# Altium integrated library CC_V1.4.IntLib: 156 symbols (part 1 of 2)
Pins are listed as number, name and electrical type; pins without a type are passive.

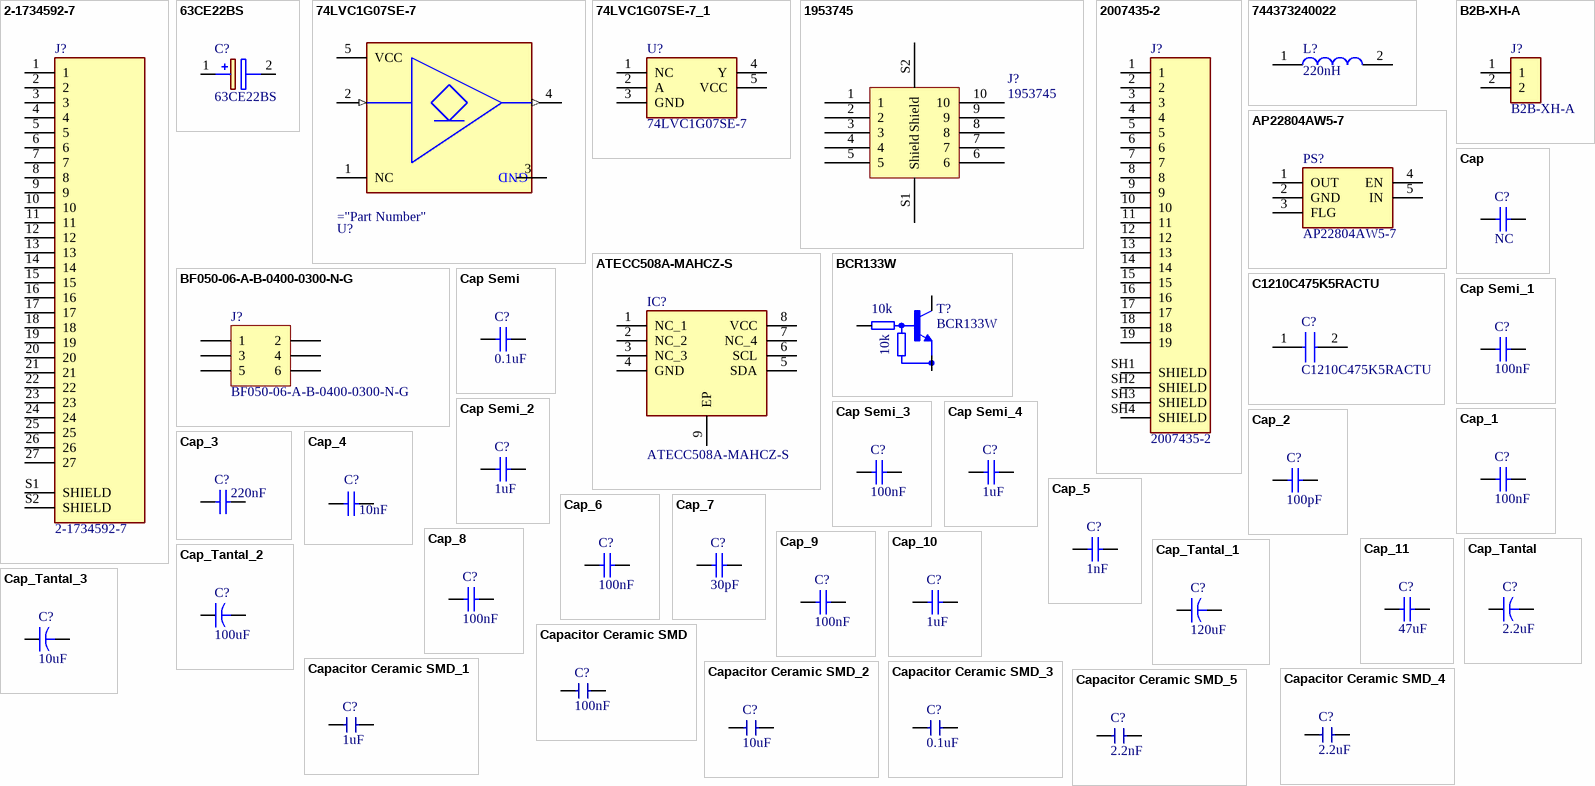
[diagram p0: symbols 2-1734592-7 to Capacitor Ceramic SMD_5]

## 2-1734592-7
designator J?
Package: None; Price: None; Value: *; MP: 2-1734592-7; Availability: Unavailable
footprint TE_2-1734592-7
pins: 1, 2, 3, 4, 5, 6, 7, 8, 9, 10, 11, 12, 13, 14, 15, 16, 17, 18, 19, 20, 21, 22, 23, 24, 25, 26, 27, S1 SHIELD, S2 SHIELD

## 63CE22BS
designator C?
Capacitor Polarised; Manufacturer_Name: Suncon; Value: 22uF; Datasheet Link: http://www.sunelec.co.jp/common/pdf/eng/CE-BS.pdf; Height: 8mm; Manufacturer_Part_Number: 63CE22BS; Arrow Part Number: 63CE22BS
footprint 63CE22BS
pins: 1 +, 2 -

## 74LVC1G07SE-7
designator U?  (value not drawn)
footprint SOT65P210X110-5N
pins: 1 NC, 2 A (in), 3 GND (power), 4 Y (out), 5 VCC (power)

## 74LVC1G07SE-7_1
designator U?, comment 74LVC1G07SE-7
Undefined or Miscellaneous; Manufacturer_Name: Diodes Inc.; Datasheet Link: https://componentsearchengine.com/Datasheets/2/74LVC1G07SE-7.pdf; Height: 1.1mm; Manufacturer_Part_Number: 74LVC1G07SE-7; Mouser Part Number: 621-74LVC1G07SE-7; Mouser Price/Stock: https://www.mouser.co.uk/ProductDetail/Diodes-Incorporated/74LVC1G07SE-7?qs=abZ1nkZpTuNoZmx9wrxFdA%3D%3D; Arrow Part Number: 74LVC1G07SE-7; Arrow Price/Stock: https://www.arrow.com/en/products/74lvc1g07se-7/diodes-incorporated
footprint SOT65P210X110-5N
pins: 1 NC, 2 A, 3 GND, 4 Y, 5 VCC

## 1953745
designator J?
footprint 1953745
footprint 1953745
pins: 1, 2, 3, 4, 5, 6, 7, 8, 9, 10, S1 Shield, S2 Shield

## 2007435-2
designator J?
Conn HDMI RCP 19 POS Solder RA Thru-Hole 19 Terminal 1 Port T/R; MF: TE Connectivity; Value: *; Package: None; MP: 2007435-2; Price: None; Availability: Unavailable; SnapEDA_Link: https://www.snapeda.com/parts/2007435-2/TE%20Connectivity%20AMP%20Connectors/view-part/1316516/?ref=snap
footprint TE_2007435-2
pins: 1, 2, 3, 4, 5, 6, 7, 8, 9, 10, 11, 12, 13, 14, 15, 16, 17, 18, 19, SH1 SHIELD, SH2 SHIELD, SH3 SHIELD, SH4 SHIELD

## 744373240022
designator L?, comment 220nH
744373240022; Manufacturer_Name: Wurth Elektronik; Datasheet Link: http://componentsearchengine.com/Datasheets/1/744373240022.pdf; Manufacturer_Part_Number: 744373240022; Arrow Part Number: 744373240022; Mouser Part Number: 710-744373240022; Mouser Price/Stock: https://www.mouser.co.uk/ProductDetail/Wurth-Elektronik/744373240022?qs=cFlH0mFHHFrAuUoRjqUUNw%3D%3D; Part Number: 744373240022
footprint WE-LHMI_402048
pins: 1, 2

## AP22804AW5-7
designator PS?
Power Supply; Manufacturer_Name: Diodes Inc.; Datasheet Link: https://componentsearchengine.com/Datasheets/2/AP22804AW5-7.pdf; Height: 1.4mm; Manufacturer_Part_Number: AP22804AW5-7; Mouser Part Number: 621-AP22804AW5-7; Mouser Price/Stock: https://www.mouser.co.uk/ProductDetail/Diodes-Incorporated/AP22804AW5-7?qs=lqAf%2FiVYw9hgcUuNhFapmA%3D%3D; Arrow Part Number: AP22804AW5-7; Arrow Price/Stock: https://www.arrow.com/en/products/ap22804aw5-7/diodes-incorporated
footprint SOT95P285X140-5N
pins: 1 OUT, 2 GND, 3 FLG, 4 EN, 5 IN

## ATECC508A-MAHCZ-S
designator IC?
Integrated Circuit; Manufacturer_Name: Microchip; Datasheet Link: http://www.mouser.com/ds/2/268/Atmel-8923S-CryptoAuth-ATECC508A-Datasheet-Summary-1065793.pdf; Height: 0.6mm; Manufacturer_Part_Number: ATECC508A-MAHCZ-S; Mouser Part Number: 556-ATECC508AMAHCZS; Mouser Price/Stock: https://www.mouser.co.uk/ProductDetail/Microchip-Technology-Atmel/ATECC508A-MAHCZ-S?qs=%2FPOkb%252BiDxRUOydmISUnqmg%3D%3D; Arrow Part Number: ATECC508A-MAHCZ-S; Arrow Price/Stock: https://www.arrow.com/en/products/atecc508a-mahcz-s/microchip-technology
footprint SON50P300X200X60-9N
footprint DFN200X300X60-9N
pins: 1 NC_1, 2 NC_2, 3 NC_3, 4 GND, 5 SDA, 6 SCL, 7 NC_4, 8 VCC, 9 EP

## B2B-XH-A
designator J?, comment Part Number: B2B-XH-A  (hidden comment: XH Connector)
Header Through Hole 2 position (2.50mm); Manufacturer_Name: JST Sales America; Datasheet Link: http://www.jst-mfg.com/product/pdf/eng/eXH.pdf; Height: 7mm; Link: https://www.digikey.sg/product-detail/en/jst-sales-america-inc/B2B-XH-A-LF-SN/455-2247-ND/1651045
footprint B2B-XH-A
pins: 1, 2
2 alternate drawings of the same symbol

## BCR133W
designator T?
<b>NPN Silicon Digital Transistor</b>  50V 0,1A 0,25W; Package: None; Price: None; Value: *; MP: BCR133W; Availability: Unavailable
footprint SOT323-BEC
pins: B, C, E
text: 10k

## BF050-06-A-B-0400-0300-N-G
designator J?, comment Part Number: BF050-06-A-B-0400-0300-N-G  (hidden comment: Pin Header pitch 2.00 mm, 6 pin)
Pin Number: 6; Pitch: 2.00 mm; Row Number: Dual; Link: https://gct.co/connector/bf050
footprint BF050-06-A-B-0400-0300-N-G
pins: 1, 2, 3, 4, 5, 6
2 alternate drawings of the same symbol

## C1210C475K5RACTU
designator C?
Capacitor, 4.7uF, 50V; Manufacturer_Name: Kemet; Datasheet Link: https://componentsearchengine.com/Datasheets/2/C1210C475K5RACTU.pdf; Height: 2.8mm; Manufacturer_Part_Number: C1210C475K5RACTU; Arrow Part Number: C1210C475K5RACTU; Arrow Price/Stock: https://www.arrow.com/en/products/c1210c475k5ractu/kemet-corporation; Mouser Part Number: 80-C1210C475K5R; Mouser Price/Stock: https://www.mouser.co.uk/ProductDetail/KEMET/C1210C475K5RACTU?qs=dB0LedT%252BmmBpncka1nOCUg%3D%3D; Value: 4.7uF; Voltage: 50V; Package: 1210
footprint CAPC3225X280N
pins: 1, 2

## Cap
designator C?  value NC  (hidden comment: Cap)
SMD capacitor; Part Number: SMD CAP (0603)
footprint CAP (0402)
footprint CAP (0603)
footprint CAP (0805)
footprint CAP (1206)
footprint CAP (0201) (Chip Capacitor, 2-Leads, Body 0/60x0/30mm, IPC Medium Density DESIGNER:ABBAS BASEREH)
pins: 1, 2

## Cap Semi
designator C?, comment 0.1uF
Capacitor (Semiconductor SIM Model); Value: 2.2nf; Published: 8-Jun-2000; LatestRevisionDate: 17-Jul-2002; LatestRevisionNote: Re-released for DXP Platform.; PackageReference: C1206; Publisher: Altium Limited
footprint C1206
footprint 0402
footprint 1310[0504]
footprint 1608[0603]
footprint C 0805 (Chip Capacitor; Body 2.0 x 1.2 mm (LxW typ))
footprint C0603
pins: 1, 2
2 alternate drawings of the same symbol

## Cap Semi_1
designator C?, comment value 100nF  (hidden comment: Cap Semi)
Capacitor (Semiconductor SIM Model); Published: 8-Jun-2000; LatestRevisionDate: 29-May-2009; LatestRevisionNote: IPC-7351 Footprint Added.; PackageReference: C1206; Publisher: Altium Limited; PackageDescription: Chip Capacitor
footprint C1206 (Chip Capacitor, Body 3.2x1.6mm, IPC High Density)
footprint 0402 (Chip Capacitor, Body 1.0x0.5mm, IPC High Density)
footprint C2512 (Chip Capacitor, Body 2.54x1.27mm, IPC High Density)
footprint 1608[0603] (Chip Capacitor, Body 1.6x0.8mm, IPC High Density)
footprint C1210 (Chip Capacitor, Body 3.2x2.5mm, IPC High Density)
simulation model CAP (Semiconductor Capacitor)
signal-integrity model Cap Semi
pins: 1, 2

## Cap Semi_2
designator C?, comment 1uF
Capacitor (Semiconductor SIM Model); Value: 2.2nf; Published: 8-Jun-2000; LatestRevisionDate: 17-Jul-2002; LatestRevisionNote: Re-released for DXP Platform.; PackageReference: C1206; Publisher: Altium Limited
footprint C1206
footprint 0402
footprint 1310[0504]
footprint 1608[0603]
footprint C 0805 (Chip Capacitor; Body 2.0 x 1.2 mm (LxW typ))
footprint C0603
pins: 1, 2
2 alternate drawings of the same symbol

## Cap Semi_3
designator C?, comment 100nF
Capacitor (Semiconductor SIM Model); Value: 2.2nf; Published: 8-Jun-2000; LatestRevisionDate: 17-Jul-2002; LatestRevisionNote: Re-released for DXP Platform.; PackageReference: C1206; Publisher: Altium Limited
footprint C1206
footprint 0402
footprint 1310[0504]
footprint 1608[0603]
footprint C 0805 (Chip Capacitor; Body 2.0 x 1.2 mm (LxW typ))
footprint C0603
pins: 1, 2
2 alternate drawings of the same symbol

## Cap Semi_4
designator C?  value 1uF
Capacitor (Semiconductor SIM Model); Published: 8-Jun-2000; LatestRevisionDate: 29-May-2009; LatestRevisionNote: IPC-7351 Footprint Added.; PackageReference: C1206; Publisher: Altium Limited; PackageDescription: Chip Capacitor
footprint C 0805 (Chip Capacitor; Body 2.0 x 1.2 mm (LxW typ))
footprint CAPC1005L (Chip Capacitor, Body 1.0x0.5mm, IPC High Density)
footprint CAPC2512L (Chip Capacitor, Body 2.54x1.27mm, IPC High Density)
footprint CAPC1608L (Chip Capacitor, Body 1.6x0.8mm, IPC High Density)
footprint CAPC3225L (Chip Capacitor, Body 3.2x2.5mm, IPC High Density)
simulation model CAP (Semiconductor Capacitor)
signal-integrity model Cap Semi
footprint C0603
pins: 1, 2

## Cap_1
designator C?, comment value 100nF  (hidden comment: Cap)
SMD capacitor; Part Number: SMD CAP (0603); Voltage: 50V
footprint CAP (0402)
footprint CAP (0603)
footprint CAP (0805)
footprint CAP (1206)
footprint CAP (0201) (Chip Capacitor, 2-Leads, Body 0/60x0/30mm, IPC Medium Density DESIGNER:ABBAS BASEREH)
pins: 1, 2

## Cap_2
designator C?, comment value 100pF  (hidden comment: Cap)
SMD capacitor; Part Number: SMD CAP (0603); Voltage: 50V
footprint CAP (0402)
footprint CAP (0603)
footprint CAP (0805)
footprint CAP (1206)
footprint CAP (0201) (Chip Capacitor, 2-Leads, Body 0/60x0/30mm, IPC Medium Density DESIGNER:ABBAS BASEREH)
pins: 1, 2

## Cap_3
designator C?, comment value 220nF  (hidden comment: Cap)
SMD capacitor; Part Number: SMD CAP (0603)
footprint CAP (0402)
footprint CAP (0603)
footprint CAP (0805)
footprint CAP (1206)
footprint CAP (0201) (Chip Capacitor, 2-Leads, Body 0/60x0/30mm, IPC Medium Density DESIGNER:ABBAS BASEREH)
pins: 1, 2

## Cap_4
designator C?, comment 10nF
SMD capacitor; Value: 10nF
footprint CAP (0402)
footprint CAP (0603)
footprint CAP (0805)
footprint CAP (1206)
footprint CAP (0201) (Chip Capacitor, 2-Leads, Body 0/60x0/30mm, IPC Medium Density DESIGNER:ABBAS BASEREH)
pins: 1, 2

## Cap_5
designator C?, comment 1nF
SMD capacitor; Value: 1nF
footprint CAP (0402)
footprint CAP (0603)
footprint CAP (0805)
footprint CAP (1206)
footprint CAP (0201) (Chip Capacitor, 2-Leads, Body 0/60x0/30mm, IPC Medium Density DESIGNER:ABBAS BASEREH)
pins: 1, 2

## Cap_6
designator C?, comment 100nF
SMD capacitor; Value: 100nF
footprint CAP (0402)
footprint CAP (0603)
footprint CAP (0805)
footprint CAP (1206)
footprint CAP (0201) (Chip Capacitor, 2-Leads, Body 0/60x0/30mm, IPC Medium Density DESIGNER:ABBAS BASEREH)
pins: 1, 2

## Cap_7
designator C?, comment value 30pF  (hidden comment: Cap)
SMD capacitor; Voltage: 50V
footprint CAP (0402)
footprint CAP (0603)
footprint CAP (0805)
footprint CAP (1206)
footprint CAP (0201) (Chip Capacitor, 2-Leads, Body 0/60x0/30mm, IPC Medium Density DESIGNER:ABBAS BASEREH)
pins: 1, 2

## Cap_8
designator C?, comment value 100nF  (hidden comment: Cap)
SMD capacitor; Voltage: 50V
footprint CAP (0402)
footprint CAP (0603)
footprint CAP (0805)
footprint CAP (1206)
footprint CAP (0201) (Chip Capacitor, 2-Leads, Body 0/60x0/30mm, IPC Medium Density DESIGNER:ABBAS BASEREH)
pins: 1, 2

## Cap_9
designator C?, comment value 100nF  (hidden comment: Cap)
SMD capacitor; Part Number: SMD CAP (0603); Voltage: 50V
footprint CAP (0402)
footprint CAP (0603)
footprint CAP (0805)
footprint CAP (1206)
pins: 1, 2
2 alternate drawings of the same symbol

## Cap_10
designator C?, comment value 1uF  (hidden comment: Cap)
SMD capacitor; Part Number: SMD CAP (0603); Voltage: 50V
footprint CAP (0402)
footprint CAP (0603)
footprint CAP (0805)
footprint CAP (1206)
pins: 1, 2
2 alternate drawings of the same symbol

## Cap_11
designator C?, comment value 47uF  (hidden comment: Cap)
SMD capacitor; Voltage: 50V
footprint CAP (0402)
footprint CAP (0603)
footprint CAP (0805)
footprint CAP (1206)
footprint CAP (0201) (Chip Capacitor, 2-Leads, Body 0/60x0/30mm, IPC Medium Density DESIGNER:ABBAS BASEREH)
pins: 1, 2

## Cap_Tantal
designator C?  value 2.2uF  (hidden comment: Cap_Tantal)
Tantalum Capacitor; Voltage: 10V
footprint TANTAL (SIZE A)
footprint TANTAL (SIZE B)
footprint TANTAL (SIZE C)
footprint TANTAL (SIZE D)
pins: 1, 2
2 alternate drawings of the same symbol

## Cap_Tantal_1
designator C?, comment value 120uF  (hidden comment: Cap_Tantal)
Tantalum Capacitor; Voltage: 10V
footprint TANTAL (SIZE A) (Capacitor, SM Tantalum; Body 3.2 x 1.6 mm (LxW typ))
footprint TANTAL (SIZE B) (Capacitor, SM Tantalum; Body 3.5 x 2.8 mm (LxW typ))
footprint TANTAL (SIZE C) (Capacitor, SM Tantalum; Body 6.0 x 3.2 mm (LxW typ))
footprint TANTAL (SIZE D) (Capacitor, SM Tantalum; Body 7.3 x 4.3 mm (LxW typ))
footprint TANTAL (SIZE E) (Capacitor, SM Tantalum; Body 7.3 x 6.0 mm (LxW typ))
pins: 1, 2

## Cap_Tantal_2
designator C?, comment value 100uF  (hidden comment: Cap_Tantal)
Tantalum Capacitor; Voltage: 10V
footprint TANTAL (SIZE A) (Capacitor, SM Tantalum; Body 3.2 x 1.6 mm (LxW typ))
footprint TANTAL (SIZE B) (Capacitor, SM Tantalum; Body 3.5 x 2.8 mm (LxW typ))
footprint TANTAL (SIZE C) (Capacitor, SM Tantalum; Body 6.0 x 3.2 mm (LxW typ))
footprint TANTAL (SIZE D) (Capacitor, SM Tantalum; Body 7.3 x 4.3 mm (LxW typ))
footprint TANTAL (SIZE E) (Capacitor, SM Tantalum; Body 7.3 x 6.0 mm (LxW typ))
pins: 1, 2

## Cap_Tantal_3
designator C?, comment value 10uF  (hidden comment: Cap_Tantal)
Tantalum Capacitor; Voltage: 10V
footprint TANTAL (SIZE A) (Capacitor, SM Tantalum; Body 3.2 x 1.6 mm (LxW typ))
footprint TANTAL (SIZE B) (Capacitor, SM Tantalum; Body 3.5 x 2.8 mm (LxW typ))
footprint TANTAL (SIZE C) (Capacitor, SM Tantalum; Body 6.0 x 3.2 mm (LxW typ))
footprint TANTAL (SIZE D) (Capacitor, SM Tantalum; Body 7.3 x 4.3 mm (LxW typ))
footprint TANTAL (SIZE E) (Capacitor, SM Tantalum; Body 7.3 x 6.0 mm (LxW typ))
pins: 1, 2

## Capacitor Ceramic SMD
designator C?, comment value 100nF  (hidden comment: Ceramic Capacitor SMD)
Voltage: 10v; Tolerance: *%
footprint 0402 Capacitor
footprint 0603 Capacitor
footprint 0805 Capacitor
footprint 1206 Capacitor
footprint 1210 CAPACITOR
footprint 0201 Capacitor
footprint CAP1210 (Chip Capacitor, 2-Leads, Body 3/20x2/50mm, IPC Medium Density DESIGNER:ABBAS BASEREH)
footprint CAP1812 (Chip Capacitor, 2-Leads, Body 4/50x3/20mm, IPC Medium Density DESIGNER:ABBAS BASEREH)
footprint CAP2010 (Chip Capacitor, 2-Leads, Body 5/00x2/50mm, IPC Medium Density DESIGNER:ABBAS BASEREH)
footprint CAP2512 (Chip Capacitor, 2-Leads, Body 6/40x3/20mm, IPC Medium Density DESIGNER:ABBAS BASEREH)
pins: 1, 2

## Capacitor Ceramic SMD_1
designator C?, comment value 1uF  (hidden comment: Ceramic Capacitor SMD)
Voltage: 10v; Tolerance: *%
footprint 0402 Capacitor
footprint 0603 Capacitor
footprint 0805 Capacitor
footprint 1206 Capacitor
footprint 1210 CAPACITOR
footprint 0201 Capacitor
footprint CAP1210 (Chip Capacitor, 2-Leads, Body 3/20x2/50mm, IPC Medium Density DESIGNER:ABBAS BASEREH)
footprint CAP1812 (Chip Capacitor, 2-Leads, Body 4/50x3/20mm, IPC Medium Density DESIGNER:ABBAS BASEREH)
footprint CAP2010 (Chip Capacitor, 2-Leads, Body 5/00x2/50mm, IPC Medium Density DESIGNER:ABBAS BASEREH)
footprint CAP2512 (Chip Capacitor, 2-Leads, Body 6/40x3/20mm, IPC Medium Density DESIGNER:ABBAS BASEREH)
pins: 1, 2

## Capacitor Ceramic SMD_2
designator C?, comment value 10uF  (hidden comment: Ceramic Capacitor SMD)
Voltage: 10v; Tolerance: *%
footprint 0402 Capacitor
footprint 0603 Capacitor
footprint 0805 Capacitor
footprint 1206 Capacitor
footprint 1210 CAPACITOR
footprint 0201 Capacitor
footprint CAP1210 (Chip Capacitor, 2-Leads, Body 3/20x2/50mm, IPC Medium Density DESIGNER:ABBAS BASEREH)
footprint CAP1812 (Chip Capacitor, 2-Leads, Body 4/50x3/20mm, IPC Medium Density DESIGNER:ABBAS BASEREH)
footprint CAP2010 (Chip Capacitor, 2-Leads, Body 5/00x2/50mm, IPC Medium Density DESIGNER:ABBAS BASEREH)
footprint CAP2512 (Chip Capacitor, 2-Leads, Body 6/40x3/20mm, IPC Medium Density DESIGNER:ABBAS BASEREH)
pins: 1, 2

## Capacitor Ceramic SMD_3
designator C?, comment value 0.1uF  (hidden comment: Ceramic Capacitor SMD)
Voltage: 10v; Tolerance: *%
footprint 0402 Capacitor
footprint 0603 Capacitor
footprint 0805 Capacitor
footprint 1206 Capacitor
footprint 1210 CAPACITOR
footprint 0201 Capacitor
footprint CAP1210 (Chip Capacitor, 2-Leads, Body 3/20x2/50mm, IPC Medium Density DESIGNER:ABBAS BASEREH)
footprint CAP1812 (Chip Capacitor, 2-Leads, Body 4/50x3/20mm, IPC Medium Density DESIGNER:ABBAS BASEREH)
footprint CAP2010 (Chip Capacitor, 2-Leads, Body 5/00x2/50mm, IPC Medium Density DESIGNER:ABBAS BASEREH)
footprint CAP2512 (Chip Capacitor, 2-Leads, Body 6/40x3/20mm, IPC Medium Density DESIGNER:ABBAS BASEREH)
pins: 1, 2

## Capacitor Ceramic SMD_4
designator C?, comment value 2.2uF  (hidden comment: Ceramic Capacitor SMD)
Voltage: 10v; Tolerance: *%
footprint 0402 Capacitor
footprint 0603 Capacitor
footprint 0805 Capacitor
footprint 1206 Capacitor
footprint 1210 CAPACITOR
footprint 0201 Capacitor
footprint CAP1210 (Chip Capacitor, 2-Leads, Body 3/20x2/50mm, IPC Medium Density DESIGNER:ABBAS BASEREH)
footprint CAP1812 (Chip Capacitor, 2-Leads, Body 4/50x3/20mm, IPC Medium Density DESIGNER:ABBAS BASEREH)
footprint CAP2010 (Chip Capacitor, 2-Leads, Body 5/00x2/50mm, IPC Medium Density DESIGNER:ABBAS BASEREH)
footprint CAP2512 (Chip Capacitor, 2-Leads, Body 6/40x3/20mm, IPC Medium Density DESIGNER:ABBAS BASEREH)
pins: 1, 2

## Capacitor Ceramic SMD_5
designator C?, comment value 2.2nF  (hidden comment: Ceramic Capacitor SMD)
Voltage: 10v; Tolerance: *%
footprint 0402 Capacitor
footprint 0603 Capacitor
footprint 0805 Capacitor
footprint 1206 Capacitor
footprint 1210 CAPACITOR
footprint 0201 Capacitor
footprint CAP1210 (Chip Capacitor, 2-Leads, Body 3/20x2/50mm, IPC Medium Density DESIGNER:ABBAS BASEREH)
footprint CAP1812 (Chip Capacitor, 2-Leads, Body 4/50x3/20mm, IPC Medium Density DESIGNER:ABBAS BASEREH)
footprint CAP2010 (Chip Capacitor, 2-Leads, Body 5/00x2/50mm, IPC Medium Density DESIGNER:ABBAS BASEREH)
footprint CAP2512 (Chip Capacitor, 2-Leads, Body 6/40x3/20mm, IPC Medium Density DESIGNER:ABBAS BASEREH)
pins: 1, 2

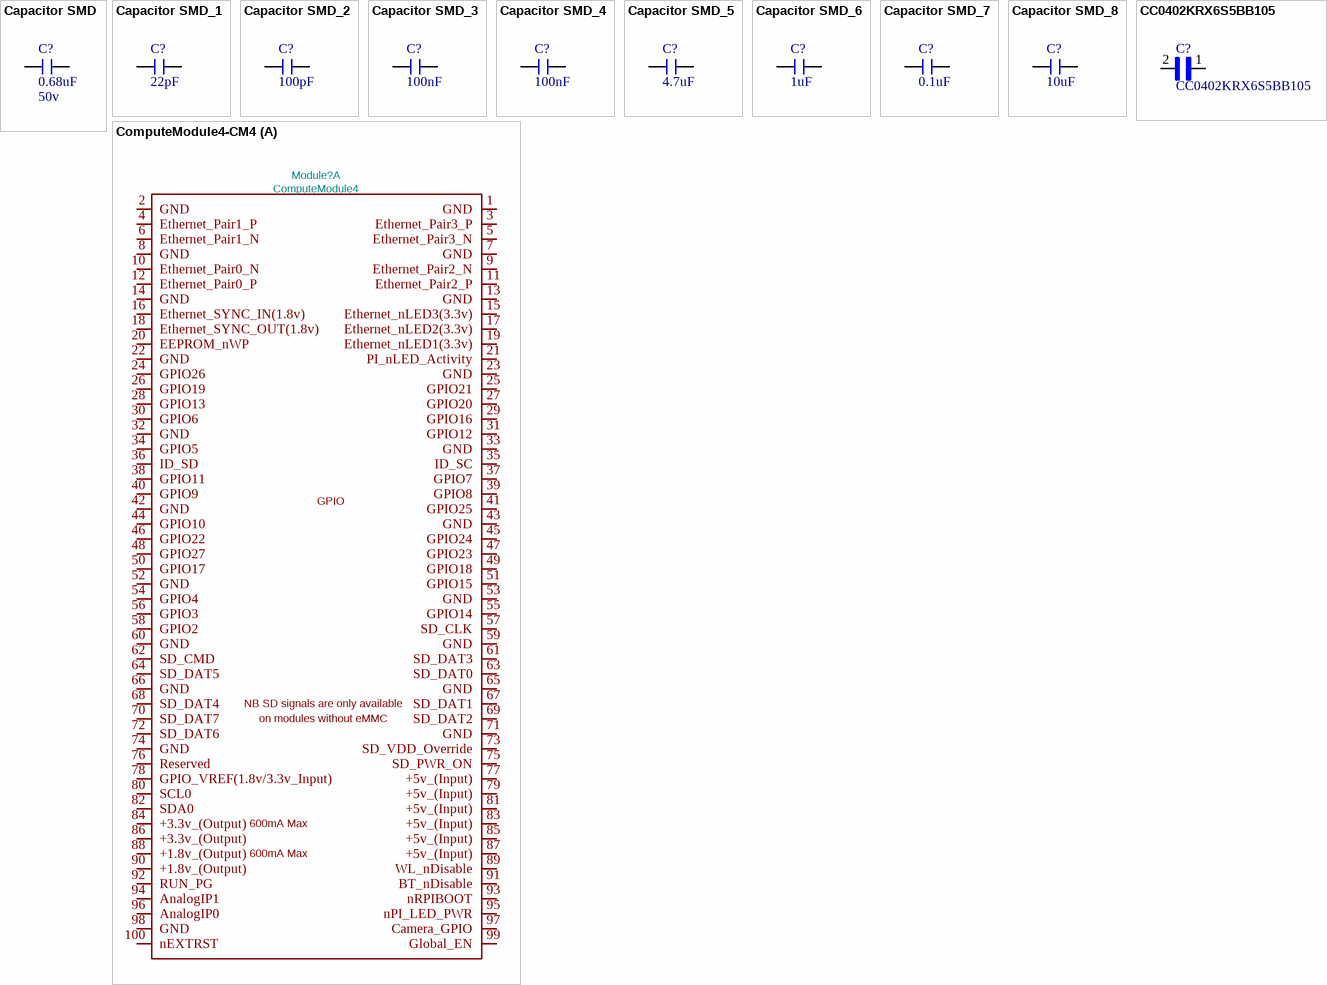
[diagram p1: symbols Capacitor SMD to ComputeModule4-CM4]

## Capacitor SMD
designator C?  value 0.68uF  Voltage: 50v  (hidden comment: Capacitor SMD)
footprint 0402 Capacitor
footprint 0603 Capacitor
footprint 0805 Capacitor
footprint 1206 Capacitor
pins: 1, 2
2 alternate drawings of the same symbol

## Capacitor SMD_1
designator C?, comment value 22pF  (hidden comment: Capacitor SMD)
Voltage: 50v
footprint 0402 Capacitor
footprint 0603 Capacitor
footprint 0805 Capacitor
footprint 1206 Capacitor
pins: 1, 2
2 alternate drawings of the same symbol

## Capacitor SMD_2
designator C?, comment value 100pF  (hidden comment: Capacitor SMD)
Voltage: 50v
footprint 0402 Capacitor
footprint 0603 Capacitor
footprint 0805 Capacitor
footprint 1206 Capacitor
pins: 1, 2
2 alternate drawings of the same symbol

## Capacitor SMD_3
designator C?, comment value 100nF  (hidden comment: Capacitor SMD)
SMD capacitor; Voltage: 50v
footprint 0402 Capacitor
footprint 0603 Capacitor
footprint 0805 Capacitor
footprint 1206 Capacitor
pins: 1, 2
2 alternate drawings of the same symbol

## Capacitor SMD_4
designator C?, comment value 100nF  (hidden comment: Capacitor SMD)
Voltage: 50v
footprint 0402 Capacitor
footprint 0603 Capacitor
footprint 0805 Capacitor
footprint 1206 Capacitor
pins: 1, 2
2 alternate drawings of the same symbol

## Capacitor SMD_5
designator C?, comment value 4.7uF  (hidden comment: Capacitor SMD)
Voltage: 50v
footprint 0402 Capacitor
footprint 0603 Capacitor
footprint 0805 Capacitor
footprint 1206 Capacitor
pins: 1, 2
2 alternate drawings of the same symbol

## Capacitor SMD_6
designator C?, comment value 1uF  (hidden comment: Capacitor SMD)
Voltage: 50v
footprint 0402 Capacitor
footprint 0603 Capacitor
footprint 0805 Capacitor
footprint 1206 Capacitor
pins: 1, 2
2 alternate drawings of the same symbol

## Capacitor SMD_7
designator C?, comment value 0.1uF  (hidden comment: Capacitor SMD)
Voltage: 50v
footprint 0402 Capacitor
footprint 0603 Capacitor
footprint 0805 Capacitor
footprint 1206 Capacitor
pins: 1, 2
2 alternate drawings of the same symbol

## Capacitor SMD_8
designator C?, comment value 10uF  (hidden comment: Capacitor SMD)
Voltage: 50v
footprint 0402 Capacitor
footprint 0603 Capacitor
footprint 0805 Capacitor
footprint 1206 Capacitor
pins: 1, 2
2 alternate drawings of the same symbol

## CC0402KRX6S5BB105
designator C?
CAP CER 1UF 6.3V X6S 0402; Package: None; Price: None; Value: *; MP: CC0402KRX6S5BB105; Availability: Unavailable
footprint CAPC1005X55N
pins: 1, 2

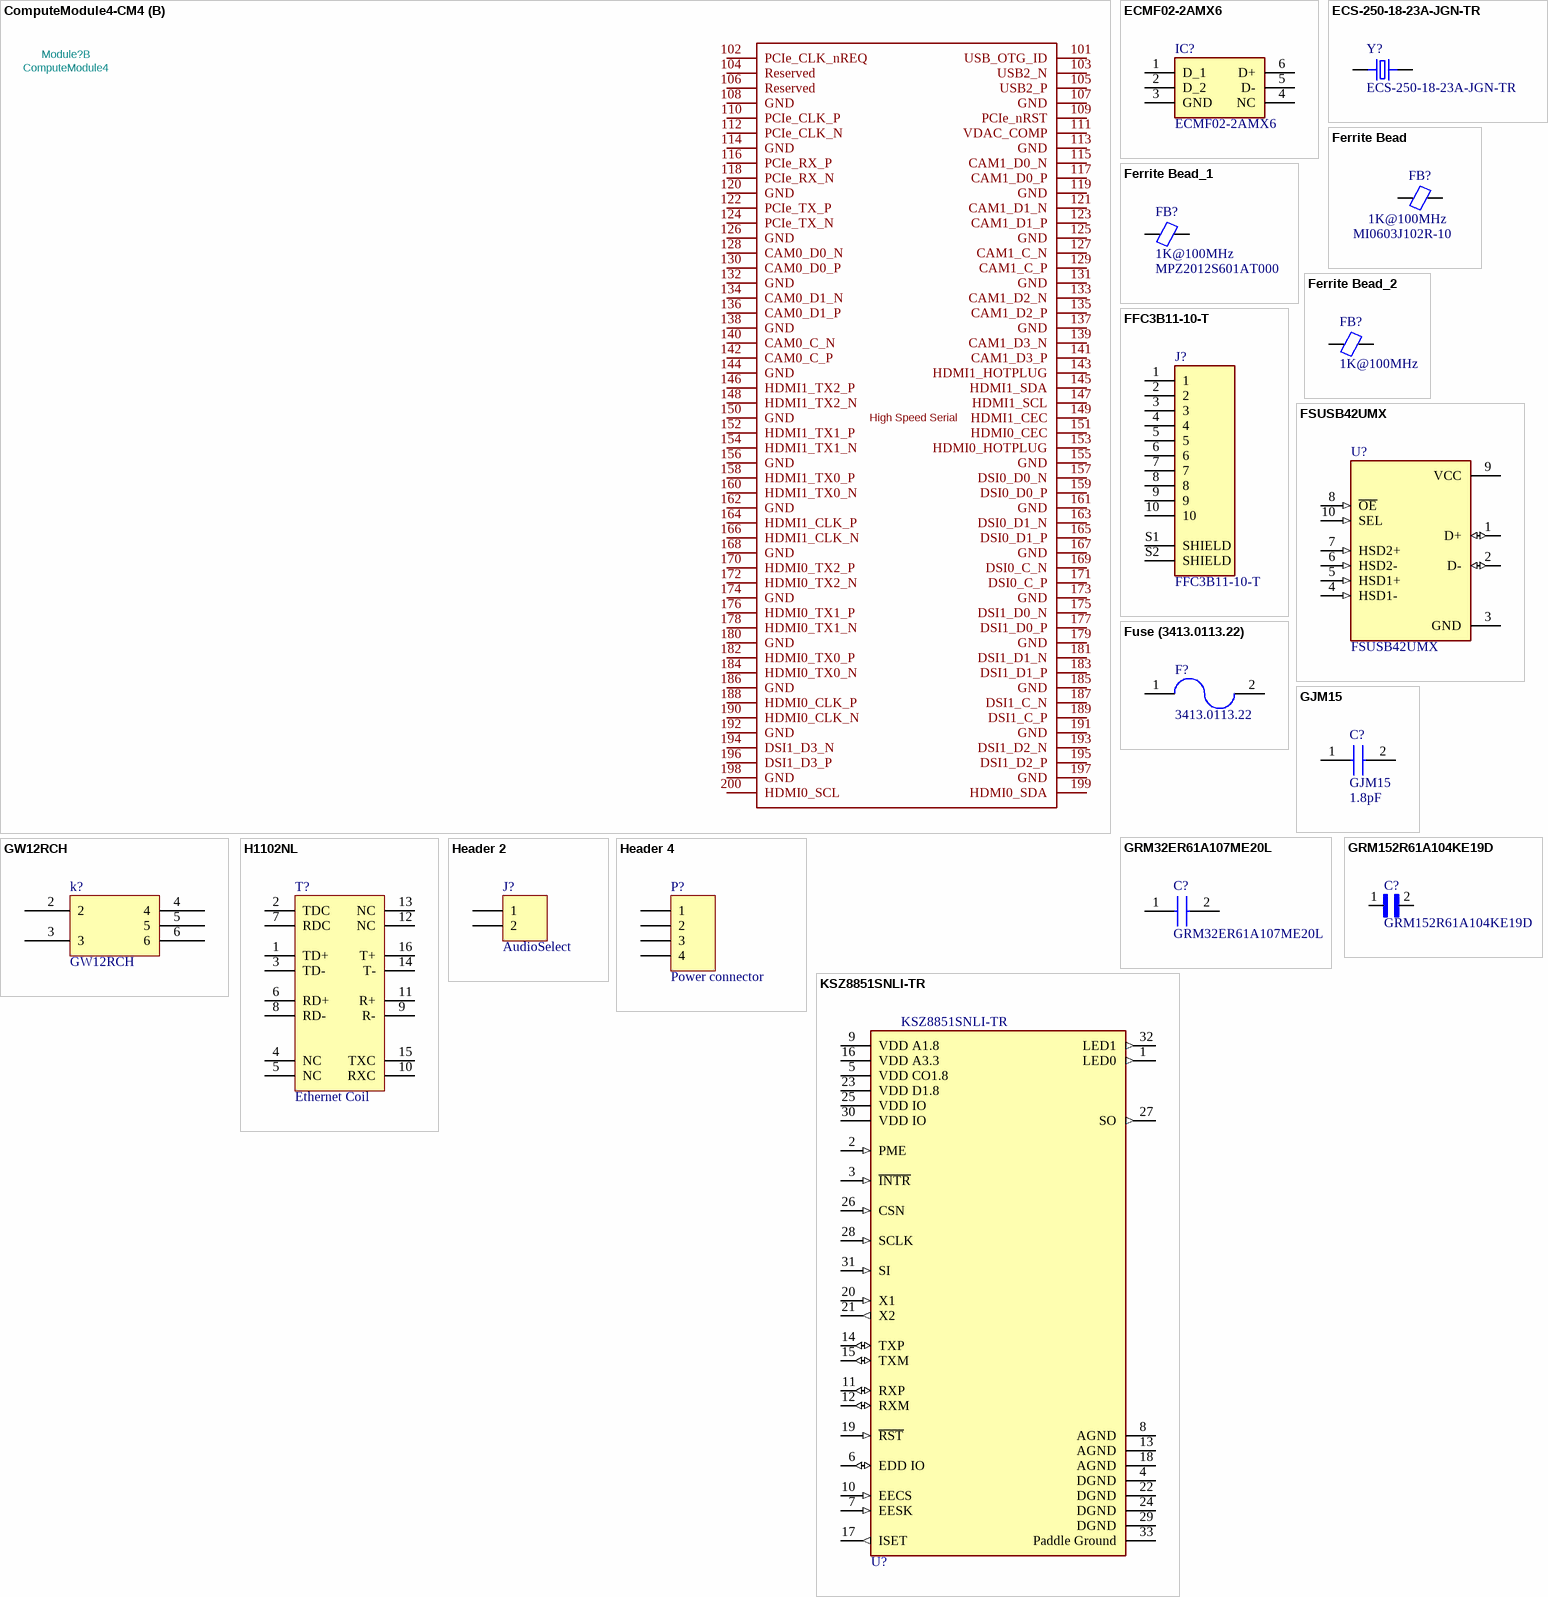
[diagram p2: symbols ComputeModule4-CM4 to KSZ8851SNLI-TR]

## ComputeModule4-CM4
designator Module?, comment ComputeModule4
Part Description: 100 Position Connector Receptacle, Center Strip Contacts Surface Mount Gold; Field4: Hirose; Field5: 2off DF40C-100DS-0.4V; Field6: 2off DF40C-100DS-0.4V; Field7: Hirose; Value: ComputeModule4; Footprint: CM4IO:Raspberry-Pi-4-Compute-Module
footprint Raspberry-Pi-4-Compute-Module
part A pins: 1 GND, 2 GND, 3 Ethernet_Pair3_P, 4 Ethernet_Pair1_P, 5 Ethernet_Pair3_N, 6 Ethernet_Pair1_N, 7 GND, 8 GND, 9 Ethernet_Pair2_N, 10 Ethernet_Pair0_N, 11 Ethernet_Pair2_P, 12 Ethernet_Pair0_P, 13 GND, 14 GND, 15 Ethernet_nLED3(3.3v), 16 Ethernet_SYNC_IN(1.8v), 17 Ethernet_nLED2(3.3v), 18 Ethernet_SYNC_OUT(1.8v), 19 Ethernet_nLED1(3.3v), 20 EEPROM_nWP, 21 PI_nLED_Activity, 22 GND, 23 GND, 24 GPIO26, 25 GPIO21, 26 GPIO19, 27 GPIO20, 28 GPIO13, 29 GPIO16, 30 GPIO6, 31 GPIO12, 32 GND, 33 GND, 34 GPIO5, 35 ID_SC, 36 ID_SD, 37 GPIO7, 38 GPIO11, 39 GPIO8, 40 GPIO9, 41 GPIO25, 42 GND, 43 GND, 44 GPIO10, 45 GPIO24, 46 GPIO22, 47 GPIO23, 48 GPIO27, 49 GPIO18, 50 GPIO17, 51 GPIO15, 52 GND, 53 GND, 54 GPIO4, 55 GPIO14, 56 GPIO3, 57 SD_CLK, 58 GPIO2, 59 GND, 60 GND, 61 SD_DAT3, 62 SD_CMD, 63 SD_DAT0, 64 SD_DAT5, 65 GND, 66 GND, 67 SD_DAT1, 68 SD_DAT4, 69 SD_DAT2, 70 SD_DAT7, 71 GND, 72 SD_DAT6, 73 SD_VDD_Override, 74 GND, 75 SD_PWR_ON, 76 Reserved, 77 +5v_(Input), 78 GPIO_VREF(1.8v/3.3v_Input), 79 +5v_(Input), 80 SCL0, 81 +5v_(Input), 82 SDA0, 83 +5v_(Input), 84 +3.3v_(Output), 85 +5v_(Input), 86 +3.3v_(Output), 87 +5v_(Input), 88 +1.8v_(Output), 89 WL_nDisable, 90 +1.8v_(Output), 91 BT_nDisable, 92 RUN_PG, 93 nRPIBOOT, 94 AnalogIP1, 95 nPI_LED_PWR, 96 AnalogIP0, 97 Camera_GPIO, 98 GND, 99 Global_EN, 100 nEXTRST
part B pins: 101 USB_OTG_ID, 102 PCIe_CLK_nREQ, 103 USB2_N, 104 Reserved, 105 USB2_P, 106 Reserved, 107 GND, 108 GND, 109 PCIe_nRST, 110 PCIe_CLK_P, 111 VDAC_COMP, 112 PCIe_CLK_N, 113 GND, 114 GND, 115 CAM1_D0_N, 116 PCIe_RX_P, 117 CAM1_D0_P, 118 PCIe_RX_N, 119 GND, 120 GND, 121 CAM1_D1_N, 122 PCIe_TX_P, 123 CAM1_D1_P, 124 PCIe_TX_N, 125 GND, 126 GND, 127 CAM1_C_N, 128 CAM0_D0_N, 129 CAM1_C_P, 130 CAM0_D0_P, 131 GND, 132 GND, 133 CAM1_D2_N, 134 CAM0_D1_N, 135 CAM1_D2_P, 136 CAM0_D1_P, 137 GND, 138 GND, 139 CAM1_D3_N, 140 CAM0_C_N, 141 CAM1_D3_P, 142 CAM0_C_P, 143 HDMI1_HOTPLUG, 144 GND, 145 HDMI1_SDA, 146 HDMI1_TX2_P, 147 HDMI1_SCL, 148 HDMI1_TX2_N, 149 HDMI1_CEC, 150 GND, 151 HDMI0_CEC, 152 HDMI1_TX1_P, 153 HDMI0_HOTPLUG, 154 HDMI1_TX1_N, 155 GND, 156 GND, 157 DSI0_D0_N, 158 HDMI1_TX0_P, 159 DSI0_D0_P, 160 HDMI1_TX0_N, 161 GND, 162 GND, 163 DSI0_D1_N, 164 HDMI1_CLK_P, 165 DSI0_D1_P, 166 HDMI1_CLK_N, 167 GND, 168 GND, 169 DSI0_C_N, 170 HDMI0_TX2_P, 171 DSI0_C_P, 172 HDMI0_TX2_N, 173 GND, 174 GND, 175 DSI1_D0_N, 176 HDMI0_TX1_P, 177 DSI1_D0_P, 178 HDMI0_TX1_N, 179 GND, 180 GND, 181 DSI1_D1_N, 182 HDMI0_TX0_P, 183 DSI1_D1_P, 184 HDMI0_TX0_N, 185 GND, 186 GND, 187 DSI1_C_N, 188 HDMI0_CLK_P, 189 DSI1_C_P, 190 HDMI0_CLK_N, 191 GND, 192 GND, 193 DSI1_D2_N, 194 DSI1_D3_N, 195 DSI1_D2_P, 196 DSI1_D3_P, 197 GND, 198 GND, 199 HDMI0_SDA, 200 HDMI0_SCL
part A text: GPIO; NB SD signals are only available; on modules without eMMC; 600mA Max
part B text: High Speed Serial

## ECMF02-2AMX6
designator IC?
Integrated Circuit; Manufacturer_Name: STMicroelectronics; Datasheet Link: http://www.st.com/content/ccc/resource/technical/document/datasheet/3a/28/cf/d0/31/63/48/8c/CD00282307.pdf/files/CD00282307.pdf/jcr:content/translations/en.CD00282307.pdf; Height: 0.55mm; Part Number: ECMF02-2AMX6; Mouser Part Number: 511-ECMF02-2AMX6; Mouser Price/Stock: https://www.mouser.com/Search/Refine.aspx?Keyword=511-ECMF02-2AMX6; RS Part Number: 8805276P; RS Price/Stock: http://uk.rs-online.com/web/p/products/8805276P
footprint SON50P150X170X55-6N-D
pins: 1 D_1, 2 D_2, 3 GND, 4 NC, 5 D-, 6 D+

## ECS-250-18-23A-JGN-TR
designator Y?
Crystal 2-SMD, No Lead; Package: None; Price: None; Value: *; MP: ECS-250-18-23A-JGN-TR; Availability: Unavailable
footprint XTAL_ECS-250-18-23A-JGN-TR
pins: 1 IN/OUT, 2 OUT/IN

## Ferrite Bead
designator FB?  value 1K@100MHz  Part Number: MI0603J102R-10  (hidden comment: Ferrite Bead)
Ferrite Bead SMD; Link: https://www.digikey.com/product-detail/en/laird-signal-integrity-products/MI0805J102R-10/240-2551-1-ND/1015989
footprint FB0402
footprint FB0603
footprint FB0805
footprint FB1206
pins: 1, 2
2 alternate drawings of the same symbol

## Ferrite Bead_1
designator FB?, comment value 1K@100MHz  Part Number: MPZ2012S601AT000  (hidden comment: Ferrite Bead)
Ferrite Bead SMD; Link: https://www.digikey.com/product-detail/en/laird-signal-integrity-products/MI0805J102R-10/240-2551-1-ND/1015989
footprint FB0402
footprint FB0603
footprint FB0805
footprint FB1206
pins: 1, 2
2 alternate drawings of the same symbol

## Ferrite Bead_2
designator FB?, comment MI0603J102R-10: 1K@100MHz  (hidden comment: Ferrite Bead)
Ferrite Bead SMD; Link: https://www.digikey.com/product-detail/en/laird-signal-integrity-products/MI0805J102R-10/240-2551-1-ND/1015989
footprint FB0402
footprint FB0603
footprint FB0805
footprint FB1206
pins: 1, 2
2 alternate drawings of the same symbol

## FFC3B11-10-T
designator J?
10 Position FFC, FPC Connector Contacts, Top 0.039 _1.00mm_ Surface Mount, Right Angle; MF: Global Connector Technology; Value: *; Availability: Unavailable; Price: None; SnapEDA_Link: https://www.snapeda.com/parts/FFC3B11-10-T/Global%20Connector%20Technology/view-part/4223050/?ref=snap; Package: Package Analog Devices; MP: FFC3B11-10-T
footprint PCBComponent_1
pins: 1, 2, 3, 4, 5, 6, 7, 8, 9, 10, S1 SHIELD, S2 SHIELD

## FSUSB42UMX
designator U?
USB Switch IC 1 Channel 10-UMLP _1.8x1.4_; MF: ON Semiconductor; Package: UFQFN-10 ON Semiconductor; SnapEDA_Link: https://www.snapeda.com/parts/FSUSB42UMX/ON%20Semiconductor/view-part/1672388/?ref=snap; MP: FSUSB42UMX; Value: *; Availability: Unavailable; Price: None
footprint IC_FSUSB42UMX
footprint ON_Semiconductor_523BC_MFG
pins: 1 D+ (io), 2 D- (io), 3 GND (power), 4 HSD1- (in), 5 HSD1+ (in), 6 HSD2- (in), 7 HSD2+ (in), 8 ~{OE} (in), 9 VCC (power), 10 SEL (in)

## Fuse (3413.0113.22)
designator F?, comment Part Number: 3413.0113.22  (hidden comment: Fuse)
USB Host Fuse; Manufacturer_Name: SCHURTER; Datasheet Link: http://docs-emea.rs-online.com/webdocs/0ce7/0900766b80ce74f5.pdf; Height: 0.6mm; Link: https://www.digikey.sg/product-detail/en/schurter-inc/3413.0113.22/486-1675-1-ND/2870075
footprint FUSE (3413.0120.22)
pins: 1, 2

## GJM15
designator C?  value 1.8pF
Murata Capacitor; Manufacturer_Name: Murata Electronics; Height: 0.55mm
footprint GJM15
pins: 1, 2

## GRM32ER61A107ME20L
designator C?
Capacitor, 100uF, 10V; Manufacturer_Name: Murata Electronics; Datasheet Link: https://psearch.en.murata.com/capacitor/product/%23.html; Height: 2.7mm; Manufacturer_Part_Number: GRM32ER61A107ME20L; Arrow Part Number: GRM32ER61A107ME20L; Arrow Price/Stock: https://www.arrow.com/en/products/grm32er61a107me20l/murata-manufacturing; Mouser Part Number: 81-GRM32ER61A107ME0L; Mouser Price/Stock: https://www.mouser.co.uk/ProductDetail/Murata-Electronics/GRM32ER61A107ME20L?qs=QRVci0nWsCb7NlWFDLlBHA%3D%3D; Value: 100uF
footprint CAPC3225X270N
pins: 1, 2

## GRM152R61A104KE19D
designator C?
CAP CER 0.1UF 10V X5R 0402; Package: None; Price: None; Value: *; MP: GRM152R61A104KE19D; Availability: Unavailable
footprint CAPC1005X22N
pins: 1, 2

## GW12RCH
designator k?
footprint PCBComponent_1
pins: 2, 3, 4, 5, 6

## H1102NL
designator T?, comment Ethernet Coil
Ethernet Transformer; Manufacturer_Name: Pulse; Part Number: H1102NL; Datasheet Link: https://productfinder.pulseeng.com/products/datasheets/h1102nl.pdf; Height: 5.97mm
footprint SOIC127P940X597-16N (SOIC16)
pins: 1 TD+, 2 TDC, 3 TD-, 4 NC, 5 NC, 6 RD+, 7 RDC, 8 RD- (power), 9 R-, 10 RXC, 11 R+, 12 NC, 13 NC, 14 T-, 15 TXC, 16 T+ (power)

## Header 2
designator J?, comment AudioSelect
Header, 2-Pin; LatestRevisionDate: 17-Jul-2002; LatestRevisionNote: Re-released for DXP Platform.; Publisher: Altium Limited
footprint HDR1X2 (Connector; Header; 2 Position)
signal-integrity model Connector
pins: 1, 2

## Header 4
designator P?, comment Power connector
CONN HEADER VERT 4POS 2.5MM JST Sales America Inc., B4B-XH-AM(LF)(SN); LatestRevisionDate: 17-Jul-2002; LatestRevisionNote: Re-released for DXP Platform.; Publisher: Altium Limited; Part Number: B4B-XH-AM(LF)(SN)
footprint Con Reader (ABCM)_4Pin
signal-integrity model Connector
footprint XH_4Pin
pins: 1, 2, 3, 4

## KSZ8851SNLI-TR
designator U?
footprint QFN50P500X500X90-33N
pins: 1 LED0 (out), 2 PME (in), 3 ~{INTR} (in), 4 DGND (power), 5 VDD CO1.8 (power), 6 EDD IO (io), 7 EESK (in), 8 AGND (power), 9 VDD A1.8 (power), 10 EECS (in), 11 RXP (io), 12 RXM (io), 13 AGND (power), 14 TXP (io), 15 TXM (io), 16 VDD A3.3 (power), 17 ISET (out), 18 AGND (power), 19 ~{RST} (in), 20 X1 (in), 21 X2 (out), 22 DGND (power), 23 VDD D1.8 (power), 24 DGND (power), 25 VDD IO (power), 26 CSN (in), 27 SO (out), 28 SCLK (in), 29 DGND (power), 30 VDD IO (power), 31 SI (in), 32 LED1 (out), 33 Paddle Ground
